# Altium integrated library esd_library.IntLib: 970 symbols (part 2 of 6)
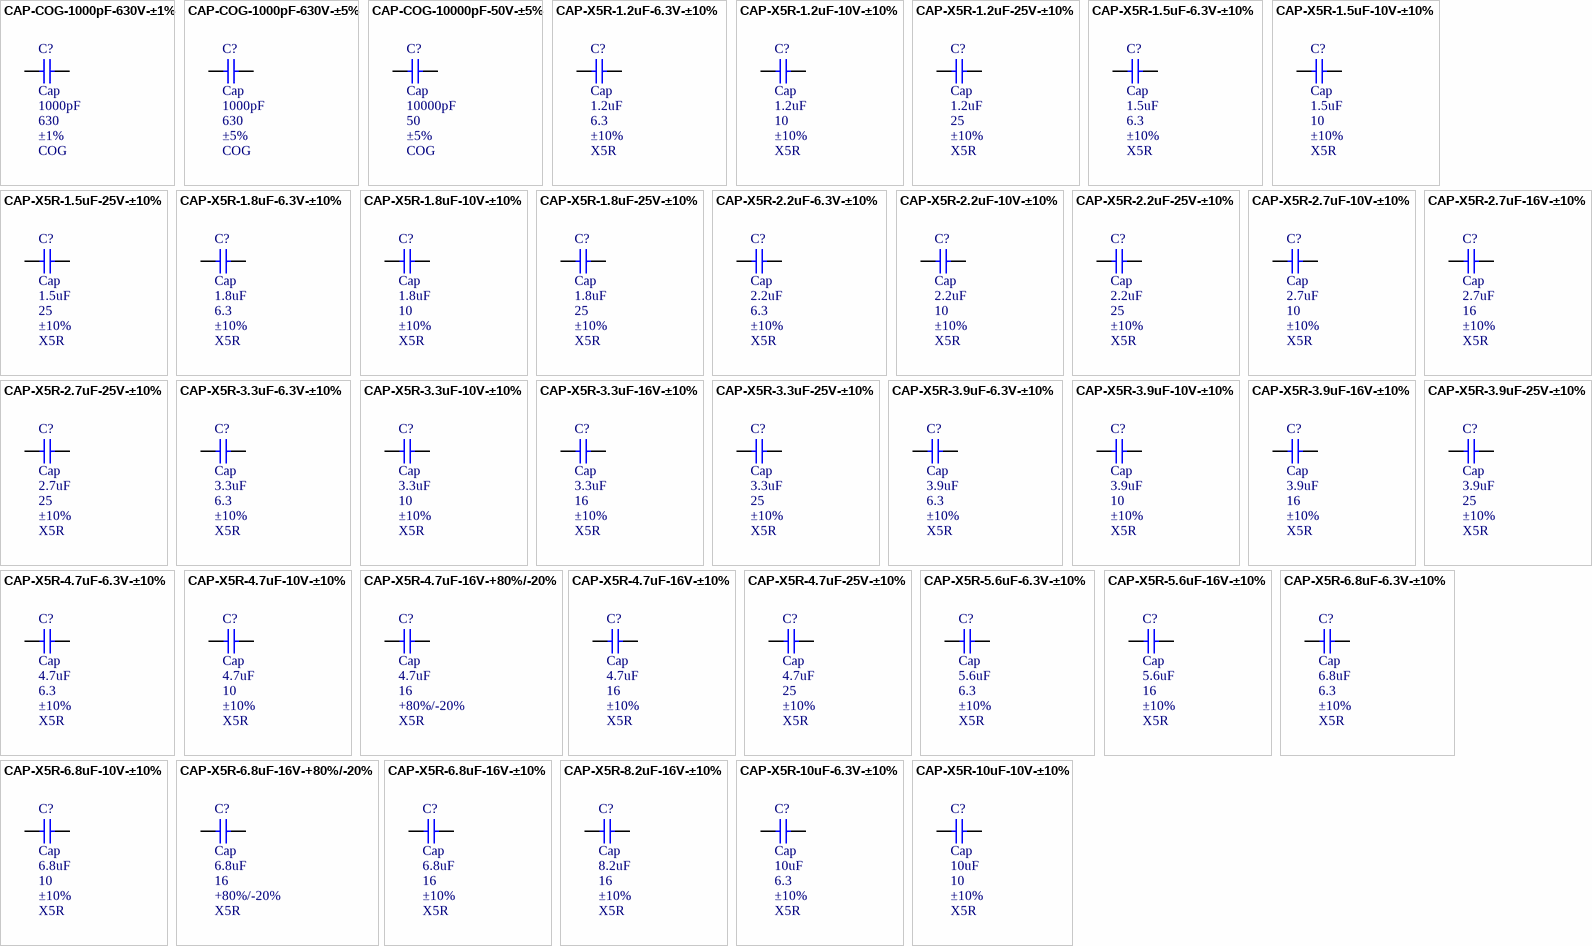
[diagram p27: symbols CAP-COG-1000pF-630V-±1% to CAP-X5R-10uF-10V-±10%]

## CAP-X5R-6.8uF-16V-+80%/-20%
designator C?, comment Cap  value 6.8uF  WV: 16  Tolerance: +80%/-20%  Type: X5R
CAP CER 6.8uF 16v X5R 1210; MPN: C1210C685Z4VACTU; Name: CAP-X5R-6.8uF-16V-+80%/-20%; PN: 399-1271-1-ND; URL: http://www.digikey.ca/product-detail/en/C1210C685Z4VACTU/399-1271-1-ND
footprint CAPC2012X09M (Chip Capacitor, 2-Leads, Body 2.00x1.25mm, IPC Low Density)
footprint CAPC3225X25M
pins: 1, 2

## CAP-X5R-6.8uF-16V-±10%
designator C?, comment Cap  value 6.8uF  WV: 16  Tolerance: ±10%  Type: X5R
CAP CER 6.8uF 16v X5R 1210; MPN: C1210C685K4PACTU; Name: CAP-X5R-6.8uF-16V-±10%; PN: 399-1288-1-ND; URL: http://www.digikey.ca/product-detail/en/C1210C685K4PACTU/399-1288-1-ND
footprint CAPC2012X09M (Chip Capacitor, 2-Leads, Body 2.00x1.25mm, IPC Low Density)
footprint CAPC3225X25M
pins: 1, 2

## CAP-X5R-8.2uF-16V-±10%
designator C?, comment Cap  value 8.2uF  WV: 16  Tolerance: ±10%  Type: X5R
CAP CER 8.2uF 16v X5R 1210; MPN: C1210C825K4PACTU; Name: CAP-X5R-8.2uF-16V-±10%; PN: 399-3149-1-ND; URL: http://www.digikey.ca/product-detail/en/C1210C825K4PACTU/399-3149-1-ND
footprint CAPC2012X09M (Chip Capacitor, 2-Leads, Body 2.00x1.25mm, IPC Low Density)
footprint CAPC3225X25M
pins: 1, 2

## CAP-X5R-10uF-6.3V-±10%
designator C?, comment Cap  value 10uF  WV: 6.3  Tolerance: ±10%  Type: X5R
CAP CER 10uF 6.3v X5R 0805; MPN: C0805C106K9PACTU; Name: CAP-X5R-10uF-6.3V-±10%; PN: 399-3138-1-ND; URL: http://www.digikey.ca/product-detail/en/C0805C106K9PACTU/399-3138-1-ND
footprint CAPC2012X09M (Chip Capacitor, 2-Leads, Body 2.00x1.25mm, IPC Low Density)
pins: 1, 2

## CAP-X5R-10uF-10V-±10%
designator C?, comment Cap  value 10uF  WV: 10  Tolerance: ±10%  Type: X5R
CAP CER 10uF 10v X5R 0805; MPN: C0805C106K8PACTU; Name: CAP-X5R-10uF-10V-±10%; PN: 399-4925-1-ND; URL: http://www.digikey.ca/product-detail/en/C0805C106K8PACTU/399-4925-1-ND
footprint CAPC2012X09M (Chip Capacitor, 2-Leads, Body 2.00x1.25mm, IPC Low Density)
pins: 1, 2

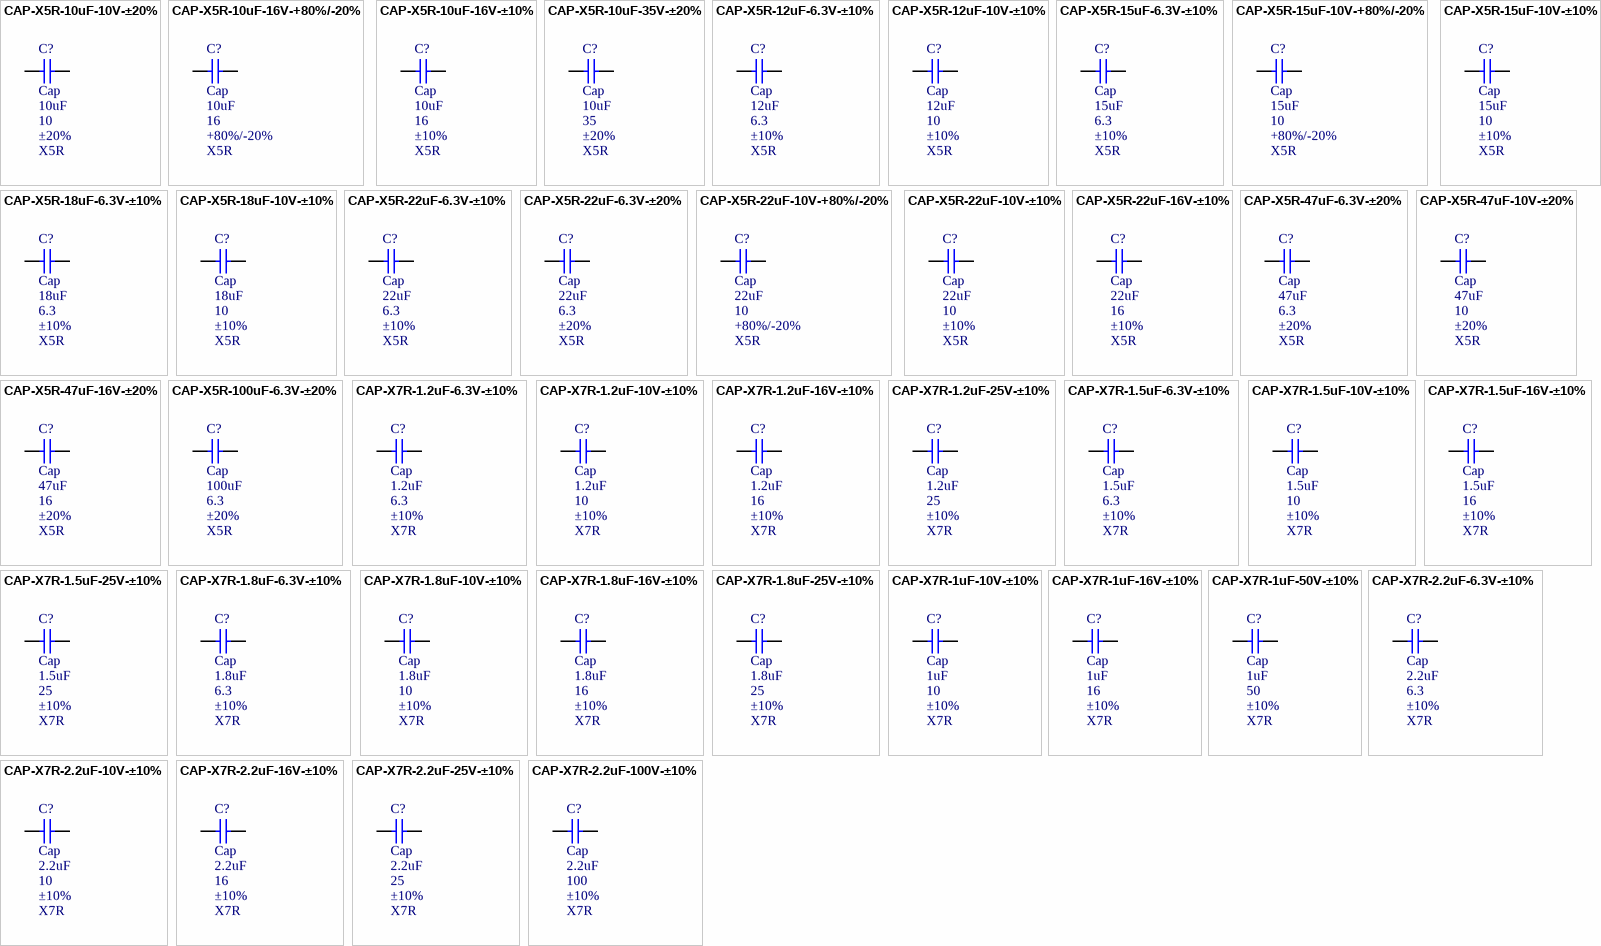
[diagram p6: symbols CAP-X5R-10uF-10V-±20% to CAP-X7R-2.2uF-100V-±10%]

## CAP-X5R-10uF-10V-±20%
designator C?, comment Cap  value 10uF  WV: 10  Tolerance: ±20%  Type: X5R
CAP CER 10uF 10v X5R 0805; MPN: C0805C106M8PACTU; Name: CAP-X5R-10uF-10V-±20%; PN: 399-4926-1-ND; URL: http://www.digikey.ca/product-detail/en/C0805C106M8PACTU/399-4926-1-ND
footprint CAPC2012X09M (Chip Capacitor, 2-Leads, Body 2.00x1.25mm, IPC Low Density)
pins: 1, 2

## CAP-X5R-10uF-16V-+80%/-20%
designator C?, comment Cap  value 10uF  WV: 16  Tolerance: +80%/-20%  Type: X5R
CAP CER 10uF 16v X5R 1210; MPN: C1210C106Z4VACTU; Name: CAP-X5R-10uF-16V-+80%/-20%; PN: 399-1272-1-ND; URL: http://www.digikey.ca/product-detail/en/C1210C106Z4VACTU/399-1272-1-ND
footprint CAPC2012X09M (Chip Capacitor, 2-Leads, Body 2.00x1.25mm, IPC Low Density)
footprint CAPC3225X25M
pins: 1, 2

## CAP-X5R-10uF-16V-±10%
designator C?, comment Cap  value 10uF  WV: 16  Tolerance: ±10%  Type: X5R
CAP CER 10uF 16v X5R 1210; MPN: C1210C106K4PACTU; Name: CAP-X5R-10uF-16V-±10%; PN: 399-3150-1-ND; URL: http://www.digikey.ca/product-detail/en/C1210C106K4PACTU/399-3150-1-ND
footprint CAPC2012X09M (Chip Capacitor, 2-Leads, Body 2.00x1.25mm, IPC Low Density)
footprint CAPC3225X25M
pins: 1, 2

## CAP-X5R-10uF-35V-±20%
designator C?, comment Cap  value 10uF  WV: 35  Tolerance: ±20%  Type: X5R
CAP CER 10uF 35v X5R 1210; MPN: C1210C106M6PACTU; Name: CAP-X5R-10uF-35V-±20%; PN: 399-5509-1-ND; URL: http://www.digikey.ca/product-detail/en/C1210C106M6PACTU/399-5509-1-ND
footprint CAPC2012X09M (Chip Capacitor, 2-Leads, Body 2.00x1.25mm, IPC Low Density)
footprint CAPC3225X25M
pins: 1, 2

## CAP-X5R-12uF-6.3V-±10%
designator C?, comment Cap  value 12uF  WV: 6.3  Tolerance: ±10%  Type: X5R
CAP CER 12uF 6.3v X5R 1210; MPN: C1210C126K9PACTU; Name: CAP-X5R-12uF-6.3V-±10%; PN: 399-3297-1-ND; URL: http://www.digikey.ca/product-detail/en/C1210C126K9PACTU/399-3297-1-ND
footprint CAPC2012X09M (Chip Capacitor, 2-Leads, Body 2.00x1.25mm, IPC Low Density)
footprint CAPC3225X25M
pins: 1, 2

## CAP-X5R-12uF-10V-±10%
designator C?, comment Cap  value 12uF  WV: 10  Tolerance: ±10%  Type: X5R
CAP CER 12uF 10v X5R 1210; MPN: C1210C126K8PACTU; Name: CAP-X5R-12uF-10V-±10%; PN: 399-3296-1-ND; URL: http://www.digikey.ca/product-detail/en/C1210C126K8PACTU/399-3296-1-ND
footprint CAPC2012X09M (Chip Capacitor, 2-Leads, Body 2.00x1.25mm, IPC Low Density)
footprint CAPC3225X25M
pins: 1, 2

## CAP-X5R-15uF-6.3V-±10%
designator C?, comment Cap  value 15uF  WV: 6.3  Tolerance: ±10%  Type: X5R
CAP CER 15uF 6.3v X5R 1210; MPN: C1210C156K9PACTU; Name: CAP-X5R-15uF-6.3V-±10%; PN: 399-3299-1-ND; URL: http://www.digikey.ca/product-detail/en/C1210C156K9PACTU/399-3299-1-ND
footprint CAPC2012X09M (Chip Capacitor, 2-Leads, Body 2.00x1.25mm, IPC Low Density)
footprint CAPC3225X25M
pins: 1, 2

## CAP-X5R-15uF-10V-+80%/-20%
designator C?, comment Cap  value 15uF  WV: 10  Tolerance: +80%/-20%  Type: X5R
CAP CER 15uF 10v X5R 1210; MPN: C1210C156Z8VACTU; Name: CAP-X5R-15uF-10V-+80%/-20%; PN: 399-1300-1-ND; URL: http://www.digikey.ca/product-detail/en/C1210C156Z8VACTU/399-1300-1-ND
footprint CAPC2012X09M (Chip Capacitor, 2-Leads, Body 2.00x1.25mm, IPC Low Density)
footprint CAPC3225X25M
pins: 1, 2

## CAP-X5R-15uF-10V-±10%
designator C?, comment Cap  value 15uF  WV: 10  Tolerance: ±10%  Type: X5R
CAP CER 15uF 10v X5R 1210; MPN: C1210C156K8PACTU; Name: CAP-X5R-15uF-10V-±10%; PN: 399-3298-1-ND; URL: http://www.digikey.ca/product-detail/en/C1210C156K8PACTU/399-3298-1-ND
footprint CAPC2012X09M (Chip Capacitor, 2-Leads, Body 2.00x1.25mm, IPC Low Density)
footprint CAPC3225X25M
pins: 1, 2

## CAP-X5R-18uF-6.3V-±10%
designator C?, comment Cap  value 18uF  WV: 6.3  Tolerance: ±10%  Type: X5R
CAP CER 18uF 6.3v X5R 1210; MPN: C1210C186K9PACTU; Name: CAP-X5R-18uF-6.3V-±10%; PN: 399-3301-1-ND; URL: http://www.digikey.ca/product-detail/en/C1210C186K9PACTU/399-3301-1-ND
footprint CAPC2012X09M (Chip Capacitor, 2-Leads, Body 2.00x1.25mm, IPC Low Density)
footprint CAPC3225X25M
pins: 1, 2

## CAP-X5R-18uF-10V-±10%
designator C?, comment Cap  value 18uF  WV: 10  Tolerance: ±10%  Type: X5R
CAP CER 18uF 10v X5R 1210; MPN: C1210C186K8PACTU; Name: CAP-X5R-18uF-10V-±10%; PN: 399-3300-1-ND; URL: http://www.digikey.ca/product-detail/en/C1210C186K8PACTU/399-3300-1-ND
footprint CAPC2012X09M (Chip Capacitor, 2-Leads, Body 2.00x1.25mm, IPC Low Density)
footprint CAPC3225X25M
pins: 1, 2

## CAP-X5R-22uF-6.3V-±10%
designator C?, comment Cap  value 22uF  WV: 6.3  Tolerance: ±10%  Type: X5R
CAP CER 22uF 6.3v X5R 1210; MPN: C1210C226K9PACTU; Name: CAP-X5R-22uF-6.3V-±10%; PN: 399-3303-1-ND; URL: http://www.digikey.ca/product-detail/en/C1210C226K9PACTU/399-3303-1-ND
footprint CAPC2012X09M (Chip Capacitor, 2-Leads, Body 2.00x1.25mm, IPC Low Density)
footprint CAPC3225X25M
pins: 1, 2

## CAP-X5R-22uF-6.3V-±20%
designator C?, comment Cap  value 22uF  WV: 6.3  Tolerance: ±20%  Type: X5R
CAP CER 22uF 6.3v X5R 0805; MPN: C0805C226M9PACTU; Name: CAP-X5R-22uF-6.3V-±20%; PN: 399-4696-1-ND; URL: http://www.digikey.ca/product-detail/en/C0805C226M9PACTU/399-4696-1-ND
footprint CAPC2012X09M (Chip Capacitor, 2-Leads, Body 2.00x1.25mm, IPC Low Density)
pins: 1, 2

## CAP-X5R-22uF-10V-+80%/-20%
designator C?, comment Cap  value 22uF  WV: 10  Tolerance: +80%/-20%  Type: X5R
CAP CER 22uF 10v X5R 1210; MPN: C1210C226Z8VACTU; Name: CAP-X5R-22uF-10V-+80%/-20%; PN: 399-1301-1-ND; URL: http://www.digikey.ca/product-detail/en/C1210C226Z8VACTU/399-1301-1-ND
footprint CAPC2012X09M (Chip Capacitor, 2-Leads, Body 2.00x1.25mm, IPC Low Density)
footprint CAPC3225X25M
pins: 1, 2

## CAP-X5R-22uF-10V-±10%
designator C?, comment Cap  value 22uF  WV: 10  Tolerance: ±10%  Type: X5R
CAP CER 22uF 10v X5R 1210; MPN: C1210C226K8PACTU; Name: CAP-X5R-22uF-10V-±10%; PN: 399-3302-1-ND; URL: http://www.digikey.ca/product-detail/en/C1210C226K8PACTU/399-3302-1-ND
footprint CAPC2012X09M (Chip Capacitor, 2-Leads, Body 2.00x1.25mm, IPC Low Density)
footprint CAPC3225X25M
pins: 1, 2

## CAP-X5R-22uF-16V-±10%
designator C?, comment Cap  value 22uF  WV: 16  Tolerance: ±10%  Type: X5R
CAP CER 22uF 16v X5R 1210; MPN: C1210C226K4PACTU; Name: CAP-X5R-22uF-16V-±10%; PN: 399-5092-1-ND; URL: http://www.digikey.ca/product-detail/en/C1210C226K4PACTU/399-5092-1-ND
footprint CAPC2012X09M (Chip Capacitor, 2-Leads, Body 2.00x1.25mm, IPC Low Density)
footprint CAPC3225X25M
pins: 1, 2

## CAP-X5R-47uF-6.3V-±20%
designator C?, comment Cap  value 47uF  WV: 6.3  Tolerance: ±20%  Type: X5R
CAP CER 47uF 6.3v X5R 0805; MPN: C0805C476M9PACTU; Name: CAP-X5R-47uF-6.3V-±20%; PN: 399-5506-1-ND; URL: http://www.digikey.ca/product-detail/en/C0805C476M9PACTU/399-5506-1-ND
footprint CAPC2012X09M (Chip Capacitor, 2-Leads, Body 2.00x1.25mm, IPC Low Density)
pins: 1, 2

## CAP-X5R-47uF-10V-±20%
designator C?, comment Cap  value 47uF  WV: 10  Tolerance: ±20%  Type: X5R
CAP CER 47uF 10v X5R 1210; MPN: C1210C476M8PACTU; Name: CAP-X5R-47uF-10V-±20%; PN: 399-5515-1-ND; URL: http://www.digikey.ca/product-detail/en/C1210C476M8PACTU/399-5515-1-ND
footprint CAPC2012X09M (Chip Capacitor, 2-Leads, Body 2.00x1.25mm, IPC Low Density)
footprint CAPC3225X25M
pins: 1, 2

## CAP-X5R-47uF-16V-±20%
designator C?, comment Cap  value 47uF  WV: 16  Tolerance: ±20%  Type: X5R
CAP CER 47uF 16v X5R 1210; MPN: C1210C476M4PACTU; Name: CAP-X5R-47uF-16V-±20%; PN: 399-5514-1-ND; URL: http://www.digikey.ca/product-detail/en/C1210C476M4PACTU/399-5514-1-ND
footprint CAPC2012X09M (Chip Capacitor, 2-Leads, Body 2.00x1.25mm, IPC Low Density)
footprint CAPC3225X25M
pins: 1, 2

## CAP-X5R-100uF-6.3V-±20%
designator C?, comment Cap  value 100uF  WV: 6.3  Tolerance: ±20%  Type: X5R
CAP CER 100uF 6.3v X5R 1210; MPN: C1210C107M9PACTU; Name: CAP-X5R-100uF-6.3V-±20%; PN: 399-4697-1-ND; URL: http://www.digikey.ca/product-detail/en/C1210C107M9PACTU/399-4697-1-ND
footprint CAPC2012X09M (Chip Capacitor, 2-Leads, Body 2.00x1.25mm, IPC Low Density)
footprint CAPC3225X25M
pins: 1, 2

## CAP-X7R-1.2uF-6.3V-±10%
designator C?, comment Cap  value 1.2uF  WV: 6.3  Tolerance: ±10%  Type: X7R
CAP CER 1.2uF 6.3v X7R 0805; MPN: C0805C125K9RACTU; Name: CAP-X7R-1.2uF-6.3V-±10%; PN: 399-4929-1-ND; URL: http://www.digikey.ca/product-detail/en/C0805C125K9RACTU/399-4929-1-ND
footprint CAPC2012X09M (Chip Capacitor, 2-Leads, Body 2.00x1.25mm, IPC Low Density)
pins: 1, 2

## CAP-X7R-1.2uF-10V-±10%
designator C?, comment Cap  value 1.2uF  WV: 10  Tolerance: ±10%  Type: X7R
CAP CER 1.2uF 10v X7R 0805; MPN: C0805C125K8RACTU; Name: CAP-X7R-1.2uF-10V-±10%; PN: 399-4928-1-ND; URL: http://www.digikey.ca/product-detail/en/C0805C125K8RACTU/399-4928-1-ND
footprint CAPC2012X09M (Chip Capacitor, 2-Leads, Body 2.00x1.25mm, IPC Low Density)
pins: 1, 2

## CAP-X7R-1.2uF-16V-±10%
designator C?, comment Cap  value 1.2uF  WV: 16  Tolerance: ±10%  Type: X7R
CAP CER 1.2uF 16v X7R 0805; MPN: C0805C125K4RACTU; Name: CAP-X7R-1.2uF-16V-±10%; PN: 399-4927-1-ND; URL: http://www.digikey.ca/product-detail/en/C0805C125K4RACTU/399-4927-1-ND
footprint CAPC2012X09M (Chip Capacitor, 2-Leads, Body 2.00x1.25mm, IPC Low Density)
pins: 1, 2

## CAP-X7R-1.2uF-25V-±10%
designator C?, comment Cap  value 1.2uF  WV: 25  Tolerance: ±10%  Type: X7R
CAP CER 1.2uF 25v X7R 1210; MPN: C1210C125K3RACTU; Name: CAP-X7R-1.2uF-25V-±10%; PN: 399-3078-1-ND; URL: http://www.digikey.ca/product-detail/en/C1210C125K3RACTU/399-3078-1-ND
footprint CAPC2012X09M (Chip Capacitor, 2-Leads, Body 2.00x1.25mm, IPC Low Density)
footprint CAPC3225X25M
pins: 1, 2

## CAP-X7R-1.5uF-6.3V-±10%
designator C?, comment Cap  value 1.5uF  WV: 6.3  Tolerance: ±10%  Type: X7R
CAP CER 1.5uF 6.3v X7R 0805; MPN: C0805C155K9RACTU; Name: CAP-X7R-1.5uF-6.3V-±10%; PN: 399-4932-1-ND; URL: http://www.digikey.ca/product-detail/en/C0805C155K9RACTU/399-4932-1-ND
footprint CAPC2012X09M (Chip Capacitor, 2-Leads, Body 2.00x1.25mm, IPC Low Density)
pins: 1, 2

## CAP-X7R-1.5uF-10V-±10%
designator C?, comment Cap  value 1.5uF  WV: 10  Tolerance: ±10%  Type: X7R
CAP CER 1.5uF 10v X7R 0805; MPN: C0805C155K8RACTU; Name: CAP-X7R-1.5uF-10V-±10%; PN: 399-4931-1-ND; URL: http://www.digikey.ca/product-detail/en/C0805C155K8RACTU/399-4931-1-ND
footprint CAPC2012X09M (Chip Capacitor, 2-Leads, Body 2.00x1.25mm, IPC Low Density)
pins: 1, 2

## CAP-X7R-1.5uF-16V-±10%
designator C?, comment Cap  value 1.5uF  WV: 16  Tolerance: ±10%  Type: X7R
CAP CER 1.5uF 16v X7R 0805; MPN: C0805C155K4RACTU; Name: CAP-X7R-1.5uF-16V-±10%; PN: 399-4930-1-ND; URL: http://www.digikey.ca/product-detail/en/C0805C155K4RACTU/399-4930-1-ND
footprint CAPC2012X09M (Chip Capacitor, 2-Leads, Body 2.00x1.25mm, IPC Low Density)
pins: 1, 2

## CAP-X7R-1.5uF-25V-±10%
designator C?, comment Cap  value 1.5uF  WV: 25  Tolerance: ±10%  Type: X7R
CAP CER 1.5uF 25v X7R 1210; MPN: C1210C155K3RACTU; Name: CAP-X7R-1.5uF-25V-±10%; PN: 399-3080-1-ND; URL: http://www.digikey.ca/product-detail/en/C1210C155K3RACTU/399-3080-1-ND
footprint CAPC2012X09M (Chip Capacitor, 2-Leads, Body 2.00x1.25mm, IPC Low Density)
footprint CAPC3225X25M
pins: 1, 2

## CAP-X7R-1.8uF-6.3V-±10%
designator C?, comment Cap  value 1.8uF  WV: 6.3  Tolerance: ±10%  Type: X7R
CAP CER 1.8uF 6.3v X7R 0805; MPN: C0805C185K9RACTU; Name: CAP-X7R-1.8uF-6.3V-±10%; PN: 399-4935-1-ND; URL: http://www.digikey.ca/product-detail/en/C0805C185K9RACTU/399-4935-1-ND
footprint CAPC2012X09M (Chip Capacitor, 2-Leads, Body 2.00x1.25mm, IPC Low Density)
pins: 1, 2

## CAP-X7R-1.8uF-10V-±10%
designator C?, comment Cap  value 1.8uF  WV: 10  Tolerance: ±10%  Type: X7R
CAP CER 1.8uF 10v X7R 0805; MPN: C0805C185K8RACTU; Name: CAP-X7R-1.8uF-10V-±10%; PN: 399-4934-1-ND; URL: http://www.digikey.ca/product-detail/en/C0805C185K8RACTU/399-4934-1-ND
footprint CAPC2012X09M (Chip Capacitor, 2-Leads, Body 2.00x1.25mm, IPC Low Density)
pins: 1, 2

## CAP-X7R-1.8uF-16V-±10%
designator C?, comment Cap  value 1.8uF  WV: 16  Tolerance: ±10%  Type: X7R
CAP CER 1.8uF 16v X7R 0805; MPN: C0805C185K4RACTU; Name: CAP-X7R-1.8uF-16V-±10%; PN: 399-4933-1-ND; URL: http://www.digikey.ca/product-detail/en/C0805C185K4RACTU/399-4933-1-ND
footprint CAPC2012X09M (Chip Capacitor, 2-Leads, Body 2.00x1.25mm, IPC Low Density)
pins: 1, 2

## CAP-X7R-1.8uF-25V-±10%
designator C?, comment Cap  value 1.8uF  WV: 25  Tolerance: ±10%  Type: X7R
CAP CER 1.8uF 25v X7R 1210; MPN: C1210C185K3RACTU; Name: CAP-X7R-1.8uF-25V-±10%; PN: 399-3082-1-ND; URL: http://www.digikey.ca/product-detail/en/C1210C185K3RACTU/399-3082-1-ND
footprint CAPC2012X09M (Chip Capacitor, 2-Leads, Body 2.00x1.25mm, IPC Low Density)
footprint CAPC3225X25M
pins: 1, 2

## CAP-X7R-1uF-10V-±10%
designator C?, comment Cap  value 1uF  WV: 10  Tolerance: ±10%  Type: X7R
CAP CER 1uF 10v X7R 0805; MPN: C0805C105K8RACTU; Name: CAP-X7R-1uF-10V-±10%; PN: 399-1172-1-ND; URL: http://www.digikey.ca/product-detail/en/C0805C105K8RACTU/399-1172-1-ND
footprint CAPC2012X09M (Chip Capacitor, 2-Leads, Body 2.00x1.25mm, IPC Low Density)
pins: 1, 2

## CAP-X7R-1uF-16V-±10%
designator C?, comment Cap  value 1uF  WV: 16  Tolerance: ±10%  Type: X7R
CAP CER 1uF 16v X7R 0805; MPN: C0805C105K4RACTU; Name: CAP-X7R-1uF-16V-±10%; PN: 399-1284-1-ND; URL: http://www.digikey.ca/product-detail/en/C0805C105K4RACTU/399-1284-1-ND
footprint CAPC2012X09M (Chip Capacitor, 2-Leads, Body 2.00x1.25mm, IPC Low Density)
pins: 1, 2

## CAP-X7R-1uF-50V-±10%
designator C?, comment Cap  value 1uF  WV: 50  Tolerance: ±10%  Type: X7R
CAP CER 1uF 50v X7R 1210; MPN: C1210C105K5RACTU; Name: CAP-X7R-1uF-50V-±10%; PN: 399-3076-1-ND; URL: http://www.digikey.ca/product-detail/en/C1210C105K5RACTU/399-3076-1-ND
footprint CAPC2012X09M (Chip Capacitor, 2-Leads, Body 2.00x1.25mm, IPC Low Density)
footprint CAPC3225X25M
pins: 1, 2

## CAP-X7R-2.2uF-6.3V-±10%
designator C?, comment Cap  value 2.2uF  WV: 6.3  Tolerance: ±10%  Type: X7R
CAP CER 2.2uF 6.3v X7R 0805; MPN: C0805C225K9RACTU; Name: CAP-X7R-2.2uF-6.3V-±10%; PN: 399-4936-1-ND; URL: http://www.digikey.ca/product-detail/en/C0805C225K9RACTU/399-4936-1-ND
footprint CAPC2012X09M (Chip Capacitor, 2-Leads, Body 2.00x1.25mm, IPC Low Density)
pins: 1, 2

## CAP-X7R-2.2uF-10V-±10%
designator C?, comment Cap  value 2.2uF  WV: 10  Tolerance: ±10%  Type: X7R
CAP CER 2.2uF 10v X7R 0805; MPN: C0805C225K8RACTU; Name: CAP-X7R-2.2uF-10V-±10%; PN: 399-3522-1-ND; URL: http://www.digikey.ca/product-detail/en/C0805C225K8RACTU/399-3522-1-ND
footprint CAPC2012X09M (Chip Capacitor, 2-Leads, Body 2.00x1.25mm, IPC Low Density)
pins: 1, 2

## CAP-X7R-2.2uF-16V-±10%
designator C?, comment Cap  value 2.2uF  WV: 16  Tolerance: ±10%  Type: X7R
CAP CER 2.2uF 16v X7R 0805; MPN: C0805C225K4RACTU; Name: CAP-X7R-2.2uF-16V-±10%; PN: 399-3523-1-ND; URL: http://www.digikey.ca/product-detail/en/C0805C225K4RACTU/399-3523-1-ND
footprint CAPC2012X09M (Chip Capacitor, 2-Leads, Body 2.00x1.25mm, IPC Low Density)
pins: 1, 2

## CAP-X7R-2.2uF-25V-±10%
designator C?, comment Cap  value 2.2uF  WV: 25  Tolerance: ±10%  Type: X7R
CAP CER 2.2uF 25v X7R 1210; MPN: C1210C225K3RACTU; Name: CAP-X7R-2.2uF-25V-±10%; PN: 399-3084-1-ND; URL: http://www.digikey.ca/product-detail/en/C1210C225K3RACTU/399-3084-1-ND
footprint CAPC2012X09M (Chip Capacitor, 2-Leads, Body 2.00x1.25mm, IPC Low Density)
footprint CAPC3225X25M
pins: 1, 2

## CAP-X7R-2.2uF-100V-±10%
designator C?, comment Cap  value 2.2uF  WV: 100  Tolerance: ±10%  Type: X7R
CAP CER 2.2uF 100v X7R 1210; MPN: C1210C225K1RACTU; Name: CAP-X7R-2.2uF-100V-±10%; PN: 399-5511-1-ND; URL: http://www.digikey.ca/product-detail/en/C1210C225K1RACTU/399-5511-1-ND
footprint CAPC2012X09M (Chip Capacitor, 2-Leads, Body 2.00x1.25mm, IPC Low Density)
footprint CAPC3225X25M
pins: 1, 2

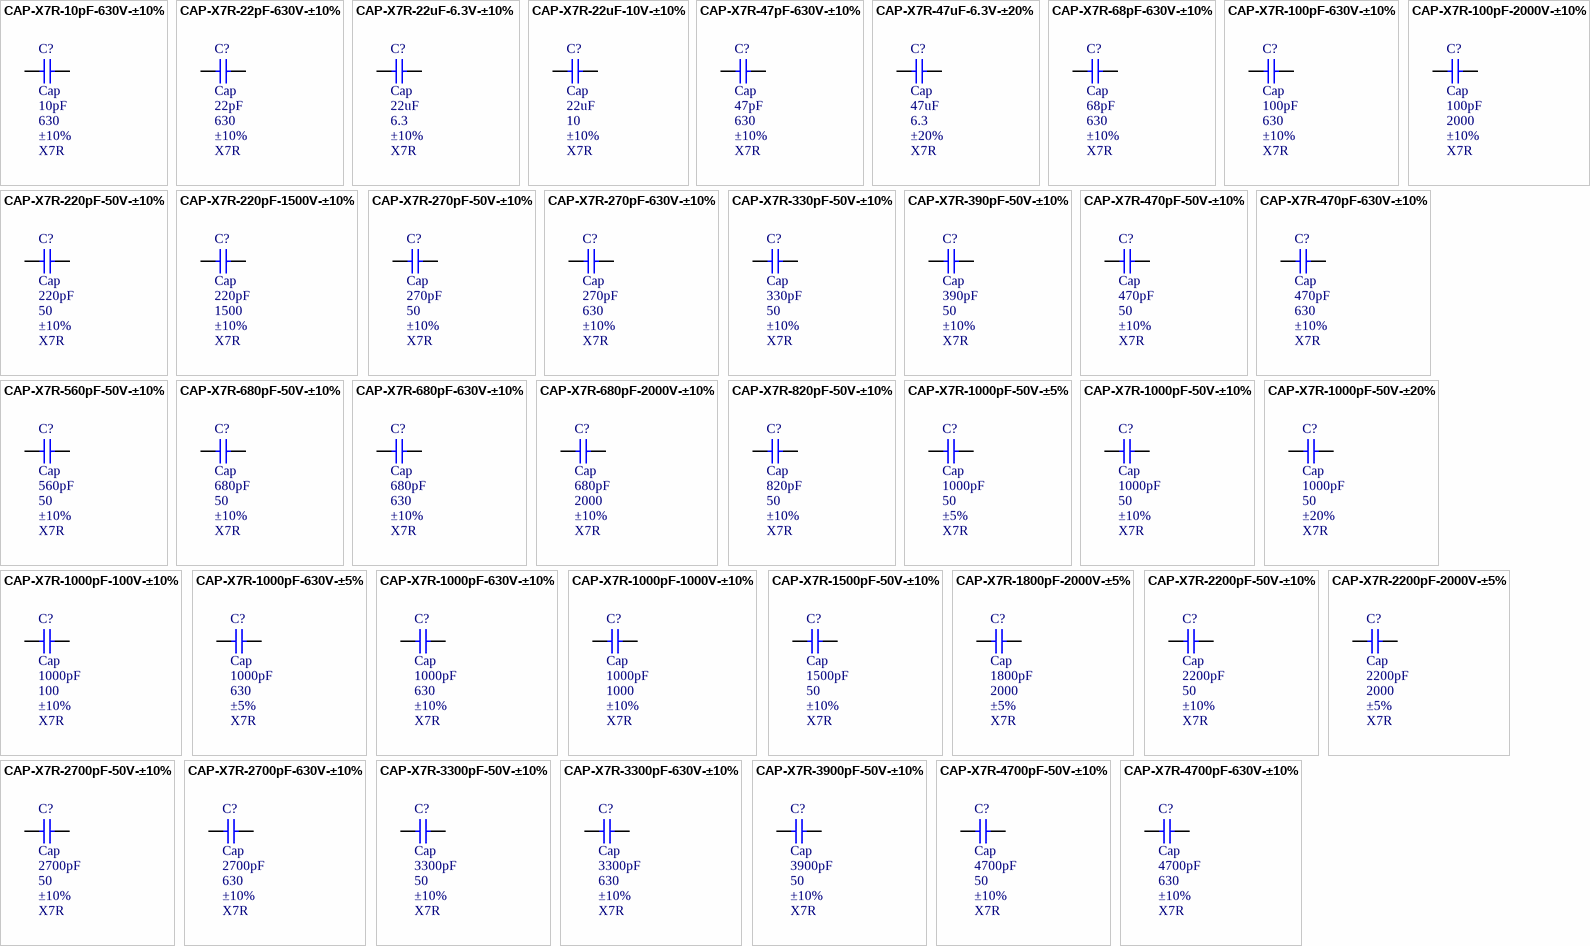
[diagram p7: symbols CAP-X7R-10pF-630V-±10% to CAP-X7R-4700pF-630V-±10%]

## CAP-X7R-10pF-630V-±10%
designator C?, comment Cap  value 10pF  WV: 630  Tolerance: ±10%  Type: X7R
CAP CER 10pF 630v X7R 0805; MPN: C0805C100KBRACTU; Name: CAP-X7R-10pF-630V-±10%; PN: 399-5567-1-ND; URL: http://www.digikey.ca/product-detail/en/C0805C100KBRACTU/399-5567-1-ND
footprint CAPC2012X09M (Chip Capacitor, 2-Leads, Body 2.00x1.25mm, IPC Low Density)
pins: 1, 2

## CAP-X7R-22pF-630V-±10%
designator C?, comment Cap  value 22pF  WV: 630  Tolerance: ±10%  Type: X7R
CAP CER 22pF 630v X7R 0805; MPN: C0805C220KBRACTU; Name: CAP-X7R-22pF-630V-±10%; PN: 399-5568-1-ND; URL: http://www.digikey.ca/product-detail/en/C0805C220KBRACTU/399-5568-1-ND
footprint CAPC2012X09M (Chip Capacitor, 2-Leads, Body 2.00x1.25mm, IPC Low Density)
pins: 1, 2

## CAP-X7R-22uF-6.3V-±10%
designator C?, comment Cap  value 22uF  WV: 6.3  Tolerance: ±10%  Type: X7R
CAP CER 22uF 6.3v X7R 1210; MPN: C1210C226K9RACTU; Name: CAP-X7R-22uF-6.3V-±10%; PN: 399-5512-1-ND; URL: http://www.digikey.ca/product-detail/en/C1210C226K9RACTU/399-5512-1-ND
footprint CAPC2012X09M (Chip Capacitor, 2-Leads, Body 2.00x1.25mm, IPC Low Density)
footprint CAPC3225X25M
pins: 1, 2

## CAP-X7R-22uF-10V-±10%
designator C?, comment Cap  value 22uF  WV: 10  Tolerance: ±10%  Type: X7R
CAP CER 22uF 10v X7R 1210; MPN: C1210C226K8RACTU; Name: CAP-X7R-22uF-10V-±10%; PN: 399-5513-1-ND; URL: http://www.digikey.ca/product-detail/en/C1210C226K8RACTU/399-5513-1-ND
footprint CAPC2012X09M (Chip Capacitor, 2-Leads, Body 2.00x1.25mm, IPC Low Density)
footprint CAPC3225X25M
pins: 1, 2

## CAP-X7R-47pF-630V-±10%
designator C?, comment Cap  value 47pF  WV: 630  Tolerance: ±10%  Type: X7R
CAP CER 47pF 630v X7R 0805; MPN: C0805C470KBRACTU; Name: CAP-X7R-47pF-630V-±10%; PN: 399-5569-1-ND; URL: http://www.digikey.ca/product-detail/en/C0805C470KBRACTU/399-5569-1-ND
footprint CAPC2012X09M (Chip Capacitor, 2-Leads, Body 2.00x1.25mm, IPC Low Density)
pins: 1, 2

## CAP-X7R-47uF-6.3V-±20%
designator C?, comment Cap  value 47uF  WV: 6.3  Tolerance: ±20%  Type: X7R
CAP CER 47uF 6.3v X7R 1210; MPN: C1210C476M9RACTU; Name: CAP-X7R-47uF-6.3V-±20%; PN: 399-5516-1-ND; URL: http://www.digikey.ca/product-detail/en/C1210C476M9RACTU/399-5516-1-ND
footprint CAPC2012X09M (Chip Capacitor, 2-Leads, Body 2.00x1.25mm, IPC Low Density)
footprint CAPC3225X25M
pins: 1, 2

## CAP-X7R-68pF-630V-±10%
designator C?, comment Cap  value 68pF  WV: 630  Tolerance: ±10%  Type: X7R
CAP CER 68pF 630v X7R 0805; MPN: C0805C680KBRACTU; Name: CAP-X7R-68pF-630V-±10%; PN: 399-5570-1-ND; URL: http://www.digikey.ca/product-detail/en/C0805C680KBRACTU/399-5570-1-ND
footprint CAPC2012X09M (Chip Capacitor, 2-Leads, Body 2.00x1.25mm, IPC Low Density)
pins: 1, 2

## CAP-X7R-100pF-630V-±10%
designator C?, comment Cap  value 100pF  WV: 630  Tolerance: ±10%  Type: X7R
CAP CER 100pF 630v X7R 0805; MPN: C0805C101KBRACTU; Name: CAP-X7R-100pF-630V-±10%; PN: 399-5571-1-ND; URL: http://www.digikey.ca/product-detail/en/C0805C101KBRACTU/399-5571-1-ND
footprint CAPC2012X09M (Chip Capacitor, 2-Leads, Body 2.00x1.25mm, IPC Low Density)
pins: 1, 2

## CAP-X7R-100pF-2000V-±10%
designator C?, comment Cap  value 100pF  WV: 2000  Tolerance: ±10%  Type: X7R
CAP CER 100pF 2000v X7R 1210; MPN: C1210C101KGRACTU; Name: CAP-X7R-100pF-2000V-±10%; PN: 399-3439-1-ND; URL: http://www.digikey.ca/product-detail/en/C1210C101KGRACTU/399-3439-1-ND
footprint CAPC2012X09M (Chip Capacitor, 2-Leads, Body 2.00x1.25mm, IPC Low Density)
footprint CAPC3225X25M
pins: 1, 2

## CAP-X7R-220pF-50V-±10%
designator C?, comment Cap  value 220pF  WV: 50  Tolerance: ±10%  Type: X7R
CAP CER 220pF 50v X7R 0805; MPN: C0805C221K5RACTU; Name: CAP-X7R-220pF-50V-±10%; PN: 399-1138-1-ND; URL: http://www.digikey.ca/product-detail/en/C0805C221K5RACTU/399-1138-1-ND
footprint CAPC2012X09M (Chip Capacitor, 2-Leads, Body 2.00x1.25mm, IPC Low Density)
pins: 1, 2

## CAP-X7R-220pF-1500V-±10%
designator C?, comment Cap  value 220pF  WV: 1500  Tolerance: ±10%  Type: X7R
CAP CER 220pF 1500v X7R 1210; MPN: C1210C221KFRACTU; Name: CAP-X7R-220pF-1500V-±10%; PN: 399-3440-1-ND; URL: http://www.digikey.ca/product-detail/en/C1210C221KFRACTU/399-3440-1-ND
footprint CAPC2012X09M (Chip Capacitor, 2-Leads, Body 2.00x1.25mm, IPC Low Density)
footprint CAPC3225X25M
pins: 1, 2

## CAP-X7R-270pF-50V-±10%
designator C?, comment Cap  value 270pF  WV: 50  Tolerance: ±10%  Type: X7R
CAP CER 270pF 50v X7R 0805; MPN: C0805C271K5RACTU; Name: CAP-X7R-270pF-50V-±10%; PN: 399-1139-1-ND; URL: http://www.digikey.ca/product-detail/en/C0805C271K5RACTU/399-1139-1-ND
footprint CAPC2012X09M (Chip Capacitor, 2-Leads, Body 2.00x1.25mm, IPC Low Density)
pins: 1, 2

## CAP-X7R-270pF-630V-±10%
designator C?, comment Cap  value 270pF  WV: 630  Tolerance: ±10%  Type: X7R
CAP CER 270pF 630v X7R 0805; MPN: C0805C271KBRACTU; Name: CAP-X7R-270pF-630V-±10%; PN: 399-5572-1-ND; URL: http://www.digikey.ca/product-detail/en/C0805C271KBRACTU/399-5572-1-ND
footprint CAPC2012X09M (Chip Capacitor, 2-Leads, Body 2.00x1.25mm, IPC Low Density)
pins: 1, 2

## CAP-X7R-330pF-50V-±10%
designator C?, comment Cap  value 330pF  WV: 50  Tolerance: ±10%  Type: X7R
CAP CER 330pF 50v X7R 0805; MPN: C0805C331K5RACTU; Name: CAP-X7R-330pF-50V-±10%; PN: 399-1140-1-ND; URL: http://www.digikey.ca/product-detail/en/C0805C331K5RACTU/399-1140-1-ND
footprint CAPC2012X09M (Chip Capacitor, 2-Leads, Body 2.00x1.25mm, IPC Low Density)
pins: 1, 2

## CAP-X7R-390pF-50V-±10%
designator C?, comment Cap  value 390pF  WV: 50  Tolerance: ±10%  Type: X7R
CAP CER 390pF 50v X7R 0805; MPN: C0805C391K5RACTU; Name: CAP-X7R-390pF-50V-±10%; PN: 399-1141-1-ND; URL: http://www.digikey.ca/product-detail/en/C0805C391K5RACTU/399-1141-1-ND
footprint CAPC2012X09M (Chip Capacitor, 2-Leads, Body 2.00x1.25mm, IPC Low Density)
pins: 1, 2

## CAP-X7R-470pF-50V-±10%
designator C?, comment Cap  value 470pF  WV: 50  Tolerance: ±10%  Type: X7R
CAP CER 470pF 50v X7R 0805; MPN: C0805C471K5RACTU; Name: CAP-X7R-470pF-50V-±10%; PN: 399-1142-1-ND; URL: http://www.digikey.ca/product-detail/en/C0805C471K5RACTU/399-1142-1-ND
footprint CAPC2012X09M (Chip Capacitor, 2-Leads, Body 2.00x1.25mm, IPC Low Density)
pins: 1, 2

## CAP-X7R-470pF-630V-±10%
designator C?, comment Cap  value 470pF  WV: 630  Tolerance: ±10%  Type: X7R
CAP CER 470pF 630v X7R 1210; MPN: C1210C471KBRACTU; Name: CAP-X7R-470pF-630V-±10%; PN: 399-5591-1-ND; URL: http://www.digikey.ca/product-detail/en/C1210C471KBRACTU/399-5591-1-ND
footprint CAPC2012X09M (Chip Capacitor, 2-Leads, Body 2.00x1.25mm, IPC Low Density)
footprint CAPC3225X25M
pins: 1, 2

## CAP-X7R-560pF-50V-±10%
designator C?, comment Cap  value 560pF  WV: 50  Tolerance: ±10%  Type: X7R
CAP CER 560pF 50v X7R 0805; MPN: C0805C561K5RACTU; Name: CAP-X7R-560pF-50V-±10%; PN: 399-1143-1-ND; URL: http://www.digikey.ca/product-detail/en/C0805C561K5RACTU/399-1143-1-ND
footprint CAPC2012X09M (Chip Capacitor, 2-Leads, Body 2.00x1.25mm, IPC Low Density)
pins: 1, 2

## CAP-X7R-680pF-50V-±10%
designator C?, comment Cap  value 680pF  WV: 50  Tolerance: ±10%  Type: X7R
CAP CER 680pF 50v X7R 0805; MPN: C0805C681K5RACTU; Name: CAP-X7R-680pF-50V-±10%; PN: 399-1144-1-ND; URL: http://www.digikey.ca/product-detail/en/C0805C681K5RACTU/399-1144-1-ND
footprint CAPC2012X09M (Chip Capacitor, 2-Leads, Body 2.00x1.25mm, IPC Low Density)
pins: 1, 2

## CAP-X7R-680pF-630V-±10%
designator C?, comment Cap  value 680pF  WV: 630  Tolerance: ±10%  Type: X7R
CAP CER 680pF 630v X7R 0805; MPN: C0805C681KBRACTU; Name: CAP-X7R-680pF-630V-±10%; PN: 399-5573-1-ND; URL: http://www.digikey.ca/product-detail/en/C0805C681KBRACTU/399-5573-1-ND
footprint CAPC2012X09M (Chip Capacitor, 2-Leads, Body 2.00x1.25mm, IPC Low Density)
pins: 1, 2

## CAP-X7R-680pF-2000V-±10%
designator C?, comment Cap  value 680pF  WV: 2000  Tolerance: ±10%  Type: X7R
CAP CER 680pF 2000v X7R 1210; MPN: C1210C681KGRACTU; Name: CAP-X7R-680pF-2000V-±10%; PN: 399-3441-1-ND; URL: http://www.digikey.ca/product-detail/en/C1210C681KGRACTU/399-3441-1-ND
footprint CAPC2012X09M (Chip Capacitor, 2-Leads, Body 2.00x1.25mm, IPC Low Density)
footprint CAPC3225X25M
pins: 1, 2

## CAP-X7R-820pF-50V-±10%
designator C?, comment Cap  value 820pF  WV: 50  Tolerance: ±10%  Type: X7R
CAP CER 820pF 50v X7R 0805; MPN: C0805C821K5RACTU; Name: CAP-X7R-820pF-50V-±10%; PN: 399-1145-1-ND; URL: http://www.digikey.ca/product-detail/en/C0805C821K5RACTU/399-1145-1-ND
footprint CAPC2012X09M (Chip Capacitor, 2-Leads, Body 2.00x1.25mm, IPC Low Density)
pins: 1, 2

## CAP-X7R-1000pF-50V-±5%
designator C?, comment Cap  value 1000pF  WV: 50  Tolerance: ±5%  Type: X7R
CAP CER 1000pF 50v X7R 0805; MPN: C0805C102J5RACTU; Name: CAP-X7R-1000pF-50V-±5%; PN: 399-1149-1-ND; URL: http://www.digikey.ca/product-detail/en/C0805C102J5RACTU/399-1149-1-ND
footprint CAPC2012X09M (Chip Capacitor, 2-Leads, Body 2.00x1.25mm, IPC Low Density)
pins: 1, 2

## CAP-X7R-1000pF-50V-±10%
designator C?, comment Cap  value 1000pF  WV: 50  Tolerance: ±10%  Type: X7R
CAP CER 1000pF 50v X7R 0805; MPN: C0805C102K5RACTU; Name: CAP-X7R-1000pF-50V-±10%; PN: 399-1147-1-ND; URL: http://www.digikey.ca/product-detail/en/C0805C102K5RACTU/399-1147-1-ND
footprint CAPC2012X09M (Chip Capacitor, 2-Leads, Body 2.00x1.25mm, IPC Low Density)
pins: 1, 2

## CAP-X7R-1000pF-50V-±20%
designator C?, comment Cap  value 1000pF  WV: 50  Tolerance: ±20%  Type: X7R
CAP CER 1000pF 50v X7R 0805; MPN: C0805C102M5RACTU; Name: CAP-X7R-1000pF-50V-±20%; PN: 399-1146-1-ND; URL: http://www.digikey.ca/product-detail/en/C0805C102M5RACTU/399-1146-1-ND
footprint CAPC2012X09M (Chip Capacitor, 2-Leads, Body 2.00x1.25mm, IPC Low Density)
pins: 1, 2

## CAP-X7R-1000pF-100V-±10%
designator C?, comment Cap  value 1000pF  WV: 100  Tolerance: ±10%  Type: X7R
CAP CER 1000pF 100v X7R 0805; MPN: C0805C102K1RACTU; Name: CAP-X7R-1000pF-100V-±10%; PN: 399-1148-1-ND; URL: http://www.digikey.ca/product-detail/en/C0805C102K1RACTU/399-1148-1-ND
footprint CAPC2012X09M (Chip Capacitor, 2-Leads, Body 2.00x1.25mm, IPC Low Density)
pins: 1, 2

## CAP-X7R-1000pF-630V-±5%
designator C?, comment Cap  value 1000pF  WV: 630  Tolerance: ±5%  Type: X7R
CAP CER 1000pF 630v X7R 0805; MPN: C0805C102JBRACTU; Name: CAP-X7R-1000pF-630V-±5%; PN: 399-5574-1-ND; URL: http://www.digikey.ca/product-detail/en/C0805C102JBRACTU/399-5574-1-ND
footprint CAPC2012X09M (Chip Capacitor, 2-Leads, Body 2.00x1.25mm, IPC Low Density)
pins: 1, 2

## CAP-X7R-1000pF-630V-±10%
designator C?, comment Cap  value 1000pF  WV: 630  Tolerance: ±10%  Type: X7R
CAP CER 1000pF 630v X7R 0805; MPN: C0805C102KBRACTU; Name: CAP-X7R-1000pF-630V-±10%; PN: 399-5575-1-ND; URL: http://www.digikey.ca/product-detail/en/C0805C102KBRACTU/399-5575-1-ND
footprint CAPC2012X09M (Chip Capacitor, 2-Leads, Body 2.00x1.25mm, IPC Low Density)
pins: 1, 2

## CAP-X7R-1000pF-1000V-±10%
designator C?, comment Cap  value 1000pF  WV: 1000  Tolerance: ±10%  Type: X7R
CAP CER 1000pF 1000v X7R 0805; MPN: C0805C102KDRACTU; Name: CAP-X7R-1000pF-1000V-±10%; PN: 399-4818-1-ND; URL: http://www.digikey.ca/product-detail/en/C0805C102KDRACTU/399-4818-1-ND
footprint CAPC2012X09M (Chip Capacitor, 2-Leads, Body 2.00x1.25mm, IPC Low Density)
pins: 1, 2

## CAP-X7R-1500pF-50V-±10%
designator C?, comment Cap  value 1500pF  WV: 50  Tolerance: ±10%  Type: X7R